# Altium footprint library SMD_Bauteile.PcbLib: 355 footprints (part 7 of 23)
Each footprint in its own frame and in the unit in brackets; x right, y up, seen from the top. Pads: shape width x height; smd on the part's side, far side on the other; paste and mask are expansions set on the pad; w line width, h text height; cw(c..) or ccw(c..) is an arc to the next point about the centre after c.
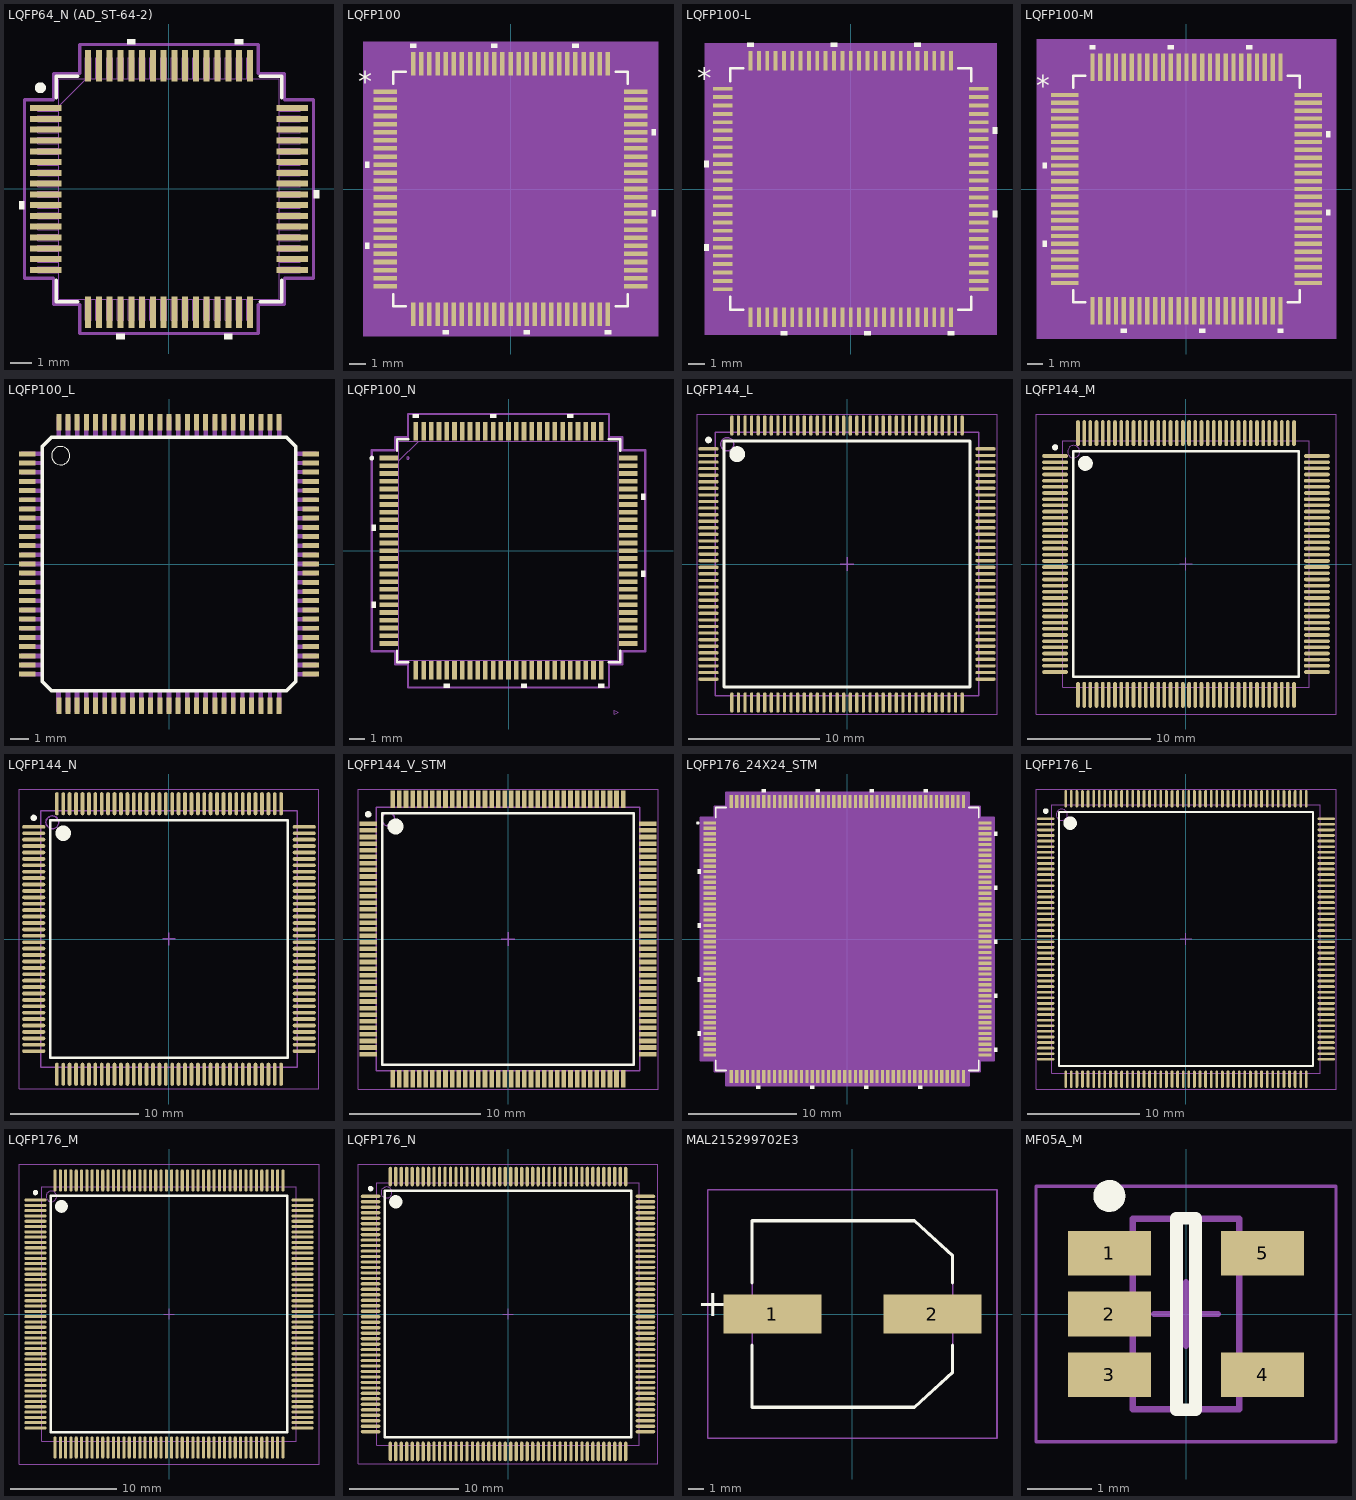
[diagram p6: the footprints below, top view; thin cyan lines are the x and y axes]

## LQFP64_N (AD_ST-64-2) [mil]
pads (64):
  rect 58x11 smd paste+0 mask+0: 1(-225,147.64) 2(-225,127.95) 3(-225,108.27) 4(-225,88.58) 5(-225,68.9) 6(-225,49.21) 7(-225,29.53) 8(-225,9.84) 9(-225,-9.84) 10(-225,-29.53) 11(-225,-49.21) 12(-225,-68.9) 13(-225,-88.58) 14(-225,-108.27) 15(-225,-127.95) 16(-225,-147.64) 33(225,-147.64) 34(225,-127.95) 35(225,-108.27) 36(225,-88.58) 37(225,-68.9) 38(225,-49.21) 39(225,-29.53) 40(225,-9.84) 41(225,9.84) 42(225,29.53) 43(225,49.21) 44(225,68.9) 45(225,88.58) 46(225,108.27) 47(225,127.95) 48(225,147.64)
  rect 11x58 smd paste+0 mask+0: 17(-147.64,-225) 18(-127.95,-225) 19(-108.27,-225) 20(-88.58,-225) 21(-68.9,-225) 22(-49.21,-225) 23(-29.53,-225) 24(-9.84,-225) 25(9.84,-225) 26(29.53,-225) 27(49.21,-225) 28(68.9,-225) 29(88.58,-225) 30(108.27,-225) 31(127.95,-225) 32(147.64,-225) 49(147.64,225) 50(127.95,225) 51(108.27,225) 52(88.58,225) 53(68.9,225) 54(49.21,225) 55(29.53,225) 56(9.84,225) 57(-9.84,225) 58(-29.53,225) 59(-49.21,225) 60(-68.9,225) 61(-88.58,225) 62(-108.27,225) 63(-127.95,225) 64(-147.64,225)
Top Overlay:
  circle w10: c-235,185 r5
  region: -61.4,264 -76.4,264 -76.4,274 -61.4,274
  region: 135.45,264 120.45,264 120.45,274 135.45,274
  region: 264,-2.34 274,-2.34 274,-17.34 264,-17.34
  region: 115.77,-264 100.77,-264 100.77,-274 115.77,-274
  region: -81.08,-264 -96.08,-264 -96.08,-274 -81.08,-274
  region: -264,-22.03 -274,-22.03 -274,-37.03 -264,-37.03
  lines w6: -206,-166.24 -206,-206 -166.24,-206 ; -206,166.24 -206,206 -166.24,206 ; 166.24,-206 206,-206 206,-166.24 ; 166.24,206 206,206 206,166.24
Mech Misc 1:
  drawing of 261 lines, arcs and shapes, not listed
Mech 15:
  lines w6: -264,-163.14 -264,163.14 -211,163.14 -211,211 -163.14,211 -163.14,264 163.14,264 163.14,211 211,211 211,163.14 264,163.14 264,-163.14 211,-163.14 211,-211 163.14,-211 163.14,-264 -163.14,-264 -163.14,-211 -211,-211 -211,-163.14 -264,-163.14
3D body: height 10, standoff 0, extent 0,0 10,10
3D body "ST_64_2_ADI.step": height 63.11, standoff 0, extent -239.99,-239.99 240.01,240.01

## LQFP100 [mil]
pads (100):
  rect 57.56x11 smd paste+0 mask+0: 1(-304,236.22) 2(-304,216.54) 3(-304,196.85) 4(-304,177.17) 5(-304,157.48) 6(-304,137.8) 7(-304,118.11) 8(-304,98.43) 9(-304,78.74) 10(-304,59.06) 11(-304,39.37) 12(-304,19.69) 13(-304,0) 14(-304,-19.68) 15(-304,-39.37) 16(-304,-59.06) 17(-304,-78.74) 18(-304,-98.43) 19(-304,-118.11) 20(-304,-137.8) 21(-304,-157.48) 22(-304,-177.17) 23(-304,-196.85) 24(-304,-216.54) 25(-304,-236.22) 51(304,-236.22) 52(304,-216.54) 53(304,-196.85) 54(304,-177.17) 55(304,-157.48) 56(304,-137.8) 57(304,-118.11) 58(304,-98.43) 59(304,-78.74) 60(304,-59.06) 61(304,-39.37) 62(304,-19.68) 63(304,0) 64(304,19.68) 65(304,39.37) 66(304,59.06) 67(304,78.74) 68(304,98.43) 69(304,118.11) 70(304,137.8) 71(304,157.48) 72(304,177.17) 73(304,196.85) 74(304,216.54) 75(304,236.22)
  rect 11x57.56 smd paste+0 mask+0: 26(-236.22,-304) 27(-216.54,-304) 28(-196.85,-304) 29(-177.17,-304) 30(-157.48,-304) 31(-137.8,-304) 32(-118.11,-304) 33(-98.43,-304) 34(-78.74,-304) 35(-59.06,-304) 36(-39.37,-304) 37(-19.68,-304) 38(0,-304) 39(19.68,-304) 40(39.37,-304) 41(59.06,-304) 42(78.74,-304) 43(98.43,-304) 44(118.11,-304) 45(137.8,-304) 46(157.48,-304) 47(177.17,-304) 48(196.85,-304) 49(216.54,-304) 50(236.22,-304) 76(236.22,304) 77(216.54,304) 78(196.85,304) 79(177.17,304) 80(157.48,304) 81(137.8,304) 82(118.11,304) 83(98.43,304) 84(78.74,304) 85(59.06,304) 86(39.37,304) 87(19.68,304) 88(0,304) 89(-19.68,304) 90(-39.37,304) 91(-59.06,304) 92(-78.74,304) 93(-98.43,304) 94(-118.11,304) 95(-137.8,304) 96(-157.48,304) 97(-177.17,304) 98(-196.85,304) 99(-216.54,304) 100(-236.22,304)
Top Overlay:
  region: -228.72,342.78 -243.72,342.78 -243.72,352.78 -228.72,352.78
  region: -31.87,342.78 -46.87,342.78 -46.87,352.78 -31.87,352.78
  region: 164.98,342.78 149.98,342.78 149.98,352.78 164.98,352.78
  region: 342.78,145.3 352.78,145.3 352.78,130.3 342.78,130.3
  region: 342.78,-51.56 352.78,-51.56 352.78,-66.56 342.78,-66.56
  region: 243.72,-342.78 228.72,-342.78 228.72,-352.78 243.72,-352.78
  region: 46.87,-342.78 31.87,-342.78 31.87,-352.78 46.87,-352.78
  region: -149.98,-342.78 -164.98,-342.78 -164.98,-352.78 -149.98,-352.78
  region: -342.78,-130.3 -352.78,-130.3 -352.78,-145.3 -342.78,-145.3
  region: -342.78,66.56 -352.78,66.56 -352.78,51.56 -342.78,51.56
  lines w6: -284.5,-254.82 -284.5,-284.5 -254.82,-284.5 ; -284.5,254.82 -284.5,284.5 -254.82,284.5 ; 254.82,-284.5 284.5,-284.5 284.5,-254.82 ; 254.82,284.5 284.5,284.5 284.5,254.82
  text "*" at -370.28,236.06 h50
Mech 5:
  region: 357.78,-357.78 -357.78,-357.78 -357.78,357.78 357.78,357.78
Mech Misc 1:
  drawing of 405 lines, arcs and shapes, not listed
  text "*" at -277,221.06 h50
Mech 15:
  region: -251.72,-289.5 -289.5,-289.5 -289.5,-251.72 -342.78,-251.72 -342.78,251.72 -289.5,251.72 -289.5,289.5 -251.72,289.5 -251.72,342.78 251.72,342.78 251.72,289.5 289.5,289.5 289.5,251.72 342.78,251.72 342.78,-251.72 289.5,-251.72 289.5,-289.5 251.72,-289.5 251.72,-342.78 -251.72,-342.78
  lines w6: -342.78,-251.72 -342.78,251.72 -289.5,251.72 -289.5,289.5 -251.72,289.5 -251.72,342.78 251.72,342.78 251.72,289.5 289.5,289.5 289.5,251.72 342.78,251.72 342.78,-251.72 289.5,-251.72 289.5,-289.5 251.72,-289.5 251.72,-342.78 -251.72,-342.78 -251.72,-289.5 -289.5,-289.5 -289.5,-251.72 -342.78,-251.72
3D body "LQFP100.step": height 63.11, standoff 0, extent -319.02,-319.02 319.02,319.02

## LQFP100-L [mm]
pads (100):
  rect 1.162x0.229 smd paste+0 mask+0: 1(-7.672,6) 2(-7.672,5.5) 3(-7.672,5) 4(-7.672,4.5) 5(-7.672,4) 6(-7.672,3.5) 7(-7.672,3) 8(-7.672,2.5) 9(-7.672,2) 10(-7.672,1.5) 11(-7.672,1) 12(-7.672,0.5) 13(-7.672,0) 14(-7.672,-0.5) 15(-7.672,-1) 16(-7.672,-1.5) 17(-7.672,-2) 18(-7.672,-2.5) 19(-7.672,-3) 20(-7.672,-3.5) 21(-7.672,-4) 22(-7.672,-4.5) 23(-7.672,-5) 24(-7.672,-5.5) 25(-7.672,-6) 51(7.672,-6) 52(7.672,-5.5) 53(7.672,-5) 54(7.672,-4.5) 55(7.672,-4) 56(7.672,-3.5) 57(7.672,-3) 58(7.672,-2.5) 59(7.672,-2) 60(7.672,-1.5) 61(7.672,-1) 62(7.672,-0.5) 63(7.672,0) 64(7.672,0.5) 65(7.672,1) 66(7.672,1.5) 67(7.672,2) 68(7.672,2.5) 69(7.672,3) 70(7.672,3.5) 71(7.672,4) 72(7.672,4.5) 73(7.672,5) 74(7.672,5.5) 75(7.672,6)
  rect 0.229x1.162 smd paste+0 mask+0: 26(-6,-7.672) 27(-5.5,-7.672) 28(-5,-7.672) 29(-4.5,-7.672) 30(-4,-7.672) 31(-3.5,-7.672) 32(-3,-7.672) 33(-2.5,-7.672) 34(-2,-7.672) 35(-1.5,-7.672) 36(-1,-7.672) 37(-0.5,-7.672) 38(0,-7.672) 39(0.5,-7.672) 40(1,-7.672) 41(1.5,-7.672) 42(2,-7.672) 43(2.5,-7.672) 44(3,-7.672) 45(3.5,-7.672) 46(4,-7.672) 47(4.5,-7.672) 48(5,-7.672) 49(5.5,-7.672) 50(6,-7.672) 76(6,7.672) 77(5.5,7.672) 78(5,7.672) 79(4.5,7.672) 80(4,7.672) 81(3.5,7.672) 82(3,7.672) 83(2.5,7.672) 84(2,7.672) 85(1.5,7.672) 86(1,7.672) 87(0.5,7.672) 88(0,7.672) 89(-0.5,7.672) 90(-1,7.672) 91(-1.5,7.672) 92(-2,7.672) 93(-2.5,7.672) 94(-3,7.672) 95(-3.5,7.672) 96(-4,7.672) 97(-4.5,7.672) 98(-5,7.672) 99(-5.5,7.672) 100(-6,7.672)
Top Overlay:
  region: -8.507,1.69 -8.761,1.69 -8.761,1.309 -8.507,1.309
  region: -8.507,-3.31 -8.761,-3.31 -8.761,-3.691 -8.507,-3.691
  region: -3.809,-8.507 -4.19,-8.507 -4.19,-8.761 -3.809,-8.761
  region: 1.191,-8.507 0.81,-8.507 0.81,-8.761 1.191,-8.761
  region: 6.191,-8.507 5.81,-8.507 5.81,-8.761 6.191,-8.761
  region: 8.507,-1.309 8.761,-1.309 8.761,-1.69 8.507,-1.69
  region: 8.507,3.691 8.761,3.691 8.761,3.31 8.507,3.31
  region: 4.19,8.507 3.809,8.507 3.809,8.761 4.19,8.761
  region: -0.81,8.507 -1.191,8.507 -1.191,8.761 -0.81,8.761
  region: -5.81,8.507 -6.191,8.507 -6.191,8.761 -5.81,8.761
  lines w0.152: -7.226,-6.447 -7.226,-7.226 -6.447,-7.226 ; -7.226,6.447 -7.226,7.226 -6.447,7.226 ; 6.447,-7.226 7.226,-7.226 7.226,-6.447 ; 6.447,7.226 7.226,7.226 7.226,6.447
  text "*" at -9.205,5.996 h1.27
Mech 5:
  region: 8.735,-8.735 -8.735,-8.735 -8.735,8.735 8.735,8.735
Mech Misc 1:
  drawing of 405 lines, arcs and shapes, not listed
  text "*" at -7.036,5.615 h1.27
Mech 15:
  region: -6.216,-7.201 -7.201,-7.201 -7.201,-6.216 -8.354,-6.216 -8.354,6.216 -7.201,6.216 -7.201,7.201 -6.216,7.201 -6.216,8.354 6.216,8.354 6.216,7.201 7.201,7.201 7.201,6.216 8.354,6.216 8.354,-6.216 7.201,-6.216 7.201,-7.201 6.216,-7.201 6.216,-8.354 -6.216,-8.354
  lines w0.152: -8.354,-6.216 -7.201,-6.216 -7.201,-7.201 -6.216,-7.201 -6.216,-8.354 6.216,-8.354 6.216,-7.201 7.201,-7.201 7.201,-6.216 8.354,-6.216 8.354,6.216 7.201,6.216 7.201,7.201 6.216,7.201 6.216,8.354 -6.216,8.354 -6.216,7.201 -7.201,7.201 -7.201,6.216 -8.354,6.216 -8.354,-6.216
3D body "LQFP100.step": height 1.6, standoff 0, extent -8.103,-8.103 8.103,8.103

## LQFP100-M [mil]
pads (100):
  rect 69.37x11 smd paste+0 mask+0: 1(-305.97,236.22) 2(-305.97,216.54) 3(-305.97,196.85) 4(-305.97,177.17) 5(-305.97,157.48) 6(-305.97,137.8) 7(-305.97,118.11) 8(-305.97,98.43) 9(-305.97,78.74) 10(-305.97,59.06) 11(-305.97,39.37) 12(-305.97,19.69) 13(-305.97,0) 14(-305.97,-19.68) 15(-305.97,-39.37) 16(-305.97,-59.06) 17(-305.97,-78.74) 18(-305.97,-98.43) 19(-305.97,-118.11) 20(-305.97,-137.8) 21(-305.97,-157.48) 22(-305.97,-177.17) 23(-305.97,-196.85) 24(-305.97,-216.54) 25(-305.97,-236.22) 51(305.97,-236.22) 52(305.97,-216.54) 53(305.97,-196.85) 54(305.97,-177.17) 55(305.97,-157.48) 56(305.97,-137.8) 57(305.97,-118.11) 58(305.97,-98.43) 59(305.97,-78.74) 60(305.97,-59.06) 61(305.97,-39.37) 62(305.97,-19.68) 63(305.97,0) 64(305.97,19.68) 65(305.97,39.37) 66(305.97,59.06) 67(305.97,78.74) 68(305.97,98.43) 69(305.97,118.11) 70(305.97,137.8) 71(305.97,157.48) 72(305.97,177.17) 73(305.97,196.85) 74(305.97,216.54) 75(305.97,236.22)
  rect 11x69.37 smd paste+0 mask+0: 26(-236.22,-305.97) 27(-216.54,-305.97) 28(-196.85,-305.97) 29(-177.17,-305.97) 30(-157.48,-305.97) 31(-137.8,-305.97) 32(-118.11,-305.97) 33(-98.43,-305.97) 34(-78.74,-305.97) 35(-59.06,-305.97) 36(-39.37,-305.97) 37(-19.68,-305.97) 38(0,-305.97) 39(19.68,-305.97) 40(39.37,-305.97) 41(59.06,-305.97) 42(78.74,-305.97) 43(98.43,-305.97) 44(118.11,-305.97) 45(137.8,-305.97) 46(157.48,-305.97) 47(177.17,-305.97) 48(196.85,-305.97) 49(216.54,-305.97) 50(236.22,-305.97) 76(236.22,305.97) 77(216.54,305.97) 78(196.85,305.97) 79(177.17,305.97) 80(157.48,305.97) 81(137.8,305.97) 82(118.11,305.97) 83(98.43,305.97) 84(78.74,305.97) 85(59.06,305.97) 86(39.37,305.97) 87(19.68,305.97) 88(0,305.97) 89(-19.68,305.97) 90(-39.37,305.97) 91(-59.06,305.97) 92(-78.74,305.97) 93(-98.43,305.97) 94(-118.11,305.97) 95(-137.8,305.97) 96(-157.48,305.97) 97(-177.17,305.97) 98(-196.85,305.97) 99(-216.54,305.97) 100(-236.22,305.97)
Top Overlay:
  region: -350.65,66.56 -360.65,66.56 -360.65,51.56 -350.65,51.56
  region: -350.65,-130.3 -360.65,-130.3 -360.65,-145.3 -350.65,-145.3
  region: -149.98,-350.65 -164.98,-350.65 -164.98,-360.65 -149.98,-360.65
  region: 46.87,-350.65 31.87,-350.65 31.87,-360.65 46.87,-360.65
  region: 243.72,-350.65 228.72,-350.65 228.72,-360.65 243.72,-360.65
  region: 350.65,-51.56 360.65,-51.56 360.65,-66.56 350.65,-66.56
  region: 350.65,145.3 360.65,145.3 360.65,130.3 350.65,130.3
  region: 164.98,350.65 149.98,350.65 149.98,360.65 164.98,360.65
  region: -31.87,350.65 -46.87,350.65 -46.87,360.65 -31.87,360.65
  region: -228.72,350.65 -243.72,350.65 -243.72,360.65 -228.72,360.65
  lines w6: -284.5,-254.82 -284.5,-284.5 -254.82,-284.5 ; -284.5,254.82 -284.5,284.5 -254.82,284.5 ; 254.82,-284.5 284.5,-284.5 284.5,-254.82 ; 254.82,284.5 284.5,284.5 284.5,254.82
  text "*" at -378.15,236.06 h50
Mech 5:
  region: 375.65,-375.65 -375.65,-375.65 -375.65,375.65 375.65,375.65
Mech Misc 1:
  drawing of 405 lines, arcs and shapes, not listed
  text "*" at -277,221.06 h50
Mech 15:
  region: -261.72,-299.5 -299.5,-299.5 -299.5,-261.72 -360.65,-261.72 -360.65,261.72 -299.5,261.72 -299.5,299.5 -261.72,299.5 -261.72,360.65 261.72,360.65 261.72,299.5 299.5,299.5 299.5,261.72 360.65,261.72 360.65,-261.72 299.5,-261.72 299.5,-299.5 261.72,-299.5 261.72,-360.65 -261.72,-360.65
  lines w6: -360.65,-261.72 -299.5,-261.72 -299.5,-299.5 -261.72,-299.5 -261.72,-360.65 261.72,-360.65 261.72,-299.5 299.5,-299.5 299.5,-261.72 360.65,-261.72 360.65,261.72 299.5,261.72 299.5,299.5 261.72,299.5 261.72,360.65 -261.72,360.65 -261.72,299.5 -299.5,299.5 -299.5,261.72 -360.65,261.72 -360.65,-261.72
3D body "LQFP100.step": height 63.11, standoff 0, extent -319.02,-319.02 319.02,319.02

## LQFP100_L [mm]
pads (100):
  rect 0.9x0.27 smd: 1(-7.72,6) 2(-7.72,5.5) 3(-7.72,5) 4(-7.72,4.5) 5(-7.72,4) 6(-7.72,3.5) 7(-7.72,3) 8(-7.72,2.5) 9(-7.72,2) 10(-7.72,1.5) 11(-7.72,1) 12(-7.72,0.5) 13(-7.72,0) 14(-7.72,-0.5) 15(-7.72,-1) 16(-7.72,-1.5) 17(-7.72,-2) 18(-7.72,-2.5) 19(-7.72,-3) 20(-7.72,-3.5) 21(-7.72,-4) 22(-7.72,-4.5) 23(-7.72,-5) 24(-7.72,-5.5) 25(-7.72,-6) 51(7.72,-6) 52(7.72,-5.5) 53(7.72,-5) 54(7.72,-4.5) 55(7.72,-4) 56(7.72,-3.5) 57(7.72,-3) 58(7.72,-2.5) 59(7.72,-2) 60(7.72,-1.5) 61(7.72,-1) 62(7.72,-0.5) 63(7.72,0) 64(7.72,0.5) 65(7.72,1) 66(7.72,1.5) 67(7.72,2) 68(7.72,2.5) 69(7.72,3) 70(7.72,3.5) 71(7.72,4) 72(7.72,4.5) 73(7.72,5) 74(7.72,5.5) 75(7.72,6)
  rect 0.27x0.9 smd: 26(-6,-7.72) 27(-5.5,-7.72) 28(-5,-7.72) 29(-4.5,-7.72) 30(-4,-7.72) 31(-3.5,-7.72) 32(-3,-7.72) 33(-2.5,-7.72) 34(-2,-7.72) 35(-1.5,-7.72) 36(-1,-7.72) 37(-0.5,-7.72) 38(0,-7.72) 39(0.5,-7.72) 40(1,-7.72) 41(1.5,-7.72) 42(2,-7.72) 43(2.5,-7.72) 44(3,-7.72) 45(3.5,-7.72) 46(4,-7.72) 47(4.5,-7.72) 48(5,-7.72) 49(5.5,-7.72) 50(6,-7.72) 76(6,7.72) 77(5.5,7.72) 78(5,7.72) 79(4.5,7.72) 80(4,7.72) 81(3.5,7.72) 82(3,7.72) 83(2.5,7.72) 84(2,7.72) 85(1.5,7.72) 86(1,7.72) 87(0.5,7.72) 88(0,7.72) 89(-0.5,7.72) 90(-1,7.72) 91(-1.5,7.72) 92(-2,7.72) 93(-2.5,7.72) 94(-3,7.72) 95(-3.5,7.72) 96(-4,7.72) 97(-4.5,7.72) 98(-5,7.72) 99(-5.5,7.72) 100(-6,7.72)
Top Overlay:
  circle w0: c-5.9,5.9 r0.5
  lines w0.203: -6.9,-6.4 -6.9,6.4 -6.4,6.9 6.4,6.9 6.9,6.4 6.9,-6.4 6.4,-6.9 -6.4,-6.9 -6.9,-6.4
Mech Misc 1:
  drawing of 100 lines, arcs and shapes, not listed
3D body "LQFP100-14x14mm.step": height 1.6, standoff 0, extent -7.997,-7.997 7.997,7.997

## LQFP100_N [mil]
pads (100):
  rect 47x12 smd paste+0 mask+0: 1(-305.12,236.22) 2(-305.12,216.54) 3(-305.12,196.85) 4(-305.12,177.17) 5(-305.12,157.48) 6(-305.12,137.8) 7(-305.12,118.11) 8(-305.12,98.43) 9(-305.12,78.74) 10(-305.12,59.06) 11(-305.12,39.37) 12(-305.12,19.69) 13(-305.12,0) 14(-305.12,-19.68) 15(-305.12,-39.37) 16(-305.12,-59.06) 17(-305.12,-78.74) 18(-305.12,-98.43) 19(-305.12,-118.11) 20(-305.12,-137.8) 21(-305.12,-157.48) 22(-305.12,-177.17) 23(-305.12,-196.85) 24(-305.12,-216.54) 25(-305.12,-236.22) 51(305.12,-236.22) 52(305.12,-216.54) 53(305.12,-196.85) 54(305.12,-177.17) 55(305.12,-157.48) 56(305.12,-137.8) 57(305.12,-118.11) 58(305.12,-98.43) 59(305.12,-78.74) 60(305.12,-59.06) 61(305.12,-39.37) 62(305.12,-19.68) 63(305.12,0) 64(305.12,19.68) 65(305.12,39.37) 66(305.12,59.06) 67(305.12,78.74) 68(305.12,98.43) 69(305.12,118.11) 70(305.12,137.8) 71(305.12,157.48) 72(305.12,177.17) 73(305.12,196.85) 74(305.12,216.54) 75(305.12,236.22)
  rect 12x47 smd paste+0 mask+0: 26(-236.22,-305.12) 27(-216.54,-305.12) 28(-196.85,-305.12) 29(-177.17,-305.12) 30(-157.48,-305.12) 31(-137.8,-305.12) 32(-118.11,-305.12) 33(-98.43,-305.12) 34(-78.74,-305.12) 35(-59.06,-305.12) 36(-39.37,-305.12) 37(-19.68,-305.12) 38(0,-305.12) 39(19.68,-305.12) 40(39.37,-305.12) 41(59.06,-305.12) 42(78.74,-305.12) 43(98.43,-305.12) 44(118.11,-305.12) 45(137.8,-305.12) 46(157.48,-305.12) 47(177.17,-305.12) 48(196.85,-305.12) 49(216.54,-305.12) 50(236.22,-305.12) 76(236.22,305.12) 77(216.54,305.12) 78(196.85,305.12) 79(177.17,305.12) 80(157.48,305.12) 81(137.8,305.12) 82(118.11,305.12) 83(98.43,305.12) 84(78.74,305.12) 85(59.06,305.12) 86(39.37,305.12) 87(19.68,305.12) 88(0,305.12) 89(-19.68,305.12) 90(-39.37,305.12) 91(-59.06,305.12) 92(-78.74,305.12) 93(-98.43,305.12) 94(-118.11,305.12) 95(-137.8,305.12) 96(-157.48,305.12) 97(-177.17,305.12) 98(-196.85,305.12) 99(-216.54,305.12) 100(-236.22,305.12)
Top Overlay:
  circle w6: c-348.46,236.22 r3
  region: -228.72,338.62 -243.72,338.62 -243.72,348.62 -228.72,348.62
  region: -31.87,338.62 -46.87,338.62 -46.87,348.62 -31.87,348.62
  region: 164.98,338.62 149.98,338.62 149.98,348.62 164.98,348.62
  region: 338.62,145.3 348.62,145.3 348.62,130.3 338.62,130.3
  region: 338.62,-51.56 348.62,-51.56 348.62,-66.56 338.62,-66.56
  region: 243.72,-338.62 228.72,-338.62 228.72,-348.62 243.72,-348.62
  region: 46.87,-338.62 31.87,-338.62 31.87,-348.62 46.87,-348.62
  region: -149.98,-338.62 -164.98,-338.62 -164.98,-348.62 -149.98,-348.62
  region: -338.62,-130.3 -348.62,-130.3 -348.62,-145.3 -338.62,-145.3
  region: -338.62,66.56 -348.62,66.56 -348.62,51.56 -338.62,51.56
  lines w6: -284.5,-255.32 -284.5,-284.5 -255.32,-284.5 ; -284.5,255.32 -284.5,284.5 -255.32,284.5 ; 255.32,-284.5 284.5,-284.5 284.5,-255.32 ; 255.32,284.5 284.5,284.5 284.5,255.32
Top Courtyard:
  lines w1: 269.5,-416.12 269.5,-406.12 279.5,-411.12 269.5,-416.12
Mech Misc 1:
  circle w0: c-256.62,236.22 r3
  lines w1: -279.5,229.5 -229.5,279.5 ; -279.5,-279.5 -279.5,279.5 279.5,279.5 279.5,-279.5 -279.5,-279.5
Mech 15:
  lines w6: -348.62,-256.22 -348.62,256.22 -289.5,256.22 -289.5,289.5 -256.22,289.5 -256.22,348.62 256.22,348.62 256.22,289.5 289.5,289.5 289.5,256.22 348.62,256.22 348.62,-256.22 289.5,-256.22 289.5,-289.5 256.22,-289.5 256.22,-348.62 -256.22,-348.62 -256.22,-289.5 -289.5,-289.5 -289.5,-256.22 -348.62,-256.22
3D body "LQFP100-14x14mm.step": height 63.11, standoff 0, extent -314.84,-314.84 314.84,314.84

## LQFP144_L [mm] "Thin QFP, 144-Leads, Body 20x20mm, Pitch 0.5mm, IPC High Density"
height 1.6
pads (144):
  oval 1.55x0.25 smd: 1(-10.525,8.75) 2(-10.525,8.25) 3(-10.525,7.75) 4(-10.525,7.25) 5(-10.525,6.75) 6(-10.525,6.25) 7(-10.525,5.75) 8(-10.525,5.25) 9(-10.525,4.75) 10(-10.525,4.25) 11(-10.525,3.75) 12(-10.525,3.25) 13(-10.525,2.75) 14(-10.525,2.25) 15(-10.525,1.75) 16(-10.525,1.25) 17(-10.525,0.75) 18(-10.525,0.25) 19(-10.525,-0.25) 20(-10.525,-0.75) 21(-10.525,-1.25) 22(-10.525,-1.75) 23(-10.525,-2.25) 24(-10.525,-2.75) 25(-10.525,-3.25) 26(-10.525,-3.75) 27(-10.525,-4.25) 28(-10.525,-4.75) 29(-10.525,-5.25) 30(-10.525,-5.75) 31(-10.525,-6.25) 32(-10.525,-6.75) 33(-10.525,-7.25) 34(-10.525,-7.75) 35(-10.525,-8.25) 36(-10.525,-8.75) 73(10.525,-8.75) 74(10.525,-8.25) 75(10.525,-7.75) 76(10.525,-7.25) 77(10.525,-6.75) 78(10.525,-6.25) 79(10.525,-5.75) 80(10.525,-5.25) 81(10.525,-4.75) 82(10.525,-4.25) 83(10.525,-3.75) 84(10.525,-3.25) 85(10.525,-2.75) 86(10.525,-2.25) 87(10.525,-1.75) 88(10.525,-1.25) 89(10.525,-0.75) 90(10.525,-0.25) 91(10.525,0.25) 92(10.525,0.75) 93(10.525,1.25) 94(10.525,1.75) 95(10.525,2.25) 96(10.525,2.75) 97(10.525,3.25) 98(10.525,3.75) 99(10.525,4.25) 100(10.525,4.75) 101(10.525,5.25) 102(10.525,5.75) 103(10.525,6.25) 104(10.525,6.75) 105(10.525,7.25) 106(10.525,7.75) 107(10.525,8.25) 108(10.525,8.75)
  oval 0.25x1.55 smd: 37(-8.75,-10.525) 38(-8.25,-10.525) 39(-7.75,-10.525) 40(-7.25,-10.525) 41(-6.75,-10.525) 42(-6.25,-10.525) 43(-5.75,-10.525) 44(-5.25,-10.525) 45(-4.75,-10.525) 46(-4.25,-10.525) 47(-3.75,-10.525) 48(-3.25,-10.525) 49(-2.75,-10.525) 50(-2.25,-10.525) 51(-1.75,-10.525) 52(-1.25,-10.525) 53(-0.75,-10.525) 54(-0.25,-10.525) 55(0.25,-10.525) 56(0.75,-10.525) 57(1.25,-10.525) 58(1.75,-10.525) 59(2.25,-10.525) 60(2.75,-10.525) 61(3.25,-10.525) 62(3.75,-10.525) 63(4.25,-10.525) 64(4.75,-10.525) 65(5.25,-10.525) 66(5.75,-10.525) 67(6.25,-10.525) 68(6.75,-10.525) 69(7.25,-10.525) 70(7.75,-10.525) 71(8.25,-10.525) 72(8.75,-10.525) 109(8.75,10.525) 110(8.25,10.525) 111(7.75,10.525) 112(7.25,10.525) 113(6.75,10.525) 114(6.25,10.525) 115(5.75,10.525) 116(5.25,10.525) 117(4.75,10.525) 118(4.25,10.525) 119(3.75,10.525) 120(3.25,10.525) 121(2.75,10.525) 122(2.25,10.525) 123(1.75,10.525) 124(1.25,10.525) 125(0.75,10.525) 126(0.25,10.525) 127(-0.25,10.525) 128(-0.75,10.525) 129(-1.25,10.525) 130(-1.75,10.525) 131(-2.25,10.525) 132(-2.75,10.525) 133(-3.25,10.525) 134(-3.75,10.525) 135(-4.25,10.525) 136(-4.75,10.525) 137(-5.25,10.525) 138(-5.75,10.525) 139(-6.25,10.525) 140(-6.75,10.525) 141(-7.25,10.525) 142(-7.75,10.525) 143(-8.25,10.525) 144(-8.75,10.525)
Top Overlay:
  circle w0.25: c-10.525,9.425 r0.125
  circle w0.6: c-8.35,8.35 r0.3
  lines w0.2: -9.35,-9.35 -9.35,9.35 9.35,9.35 9.35,-9.35 -9.35,-9.35
Mech Misc 1:
  circle w0.1: c-9.1,9.1 r0.5
  lines w0.1: -10,-10 -10,10 10,10 10,-10 -10,-10
Mech 15:
  lines w0.05: -11.4,-11.4 -11.4,11.4 11.4,11.4 11.4,-11.4 -11.4,-11.4
  lines w0.1: -0.5,0 0.5,0 ; 0,-0.5 0,0.5
3D body: height 1.6, standoff 0.05, extent -10,-10 10,10
